# Altium footprint library DIP Component.PcbLib: 327 footprints (part 4 of 21)
Each footprint in its own frame and in the unit in brackets; x right, y up, seen from the top. Pads: shape width x height; smd on the part's side, far side on the other; paste and mask are expansions set on the pad; w line width, h text height; cw(c..) or ccw(c..) is an arc to the next point about the centre after c.
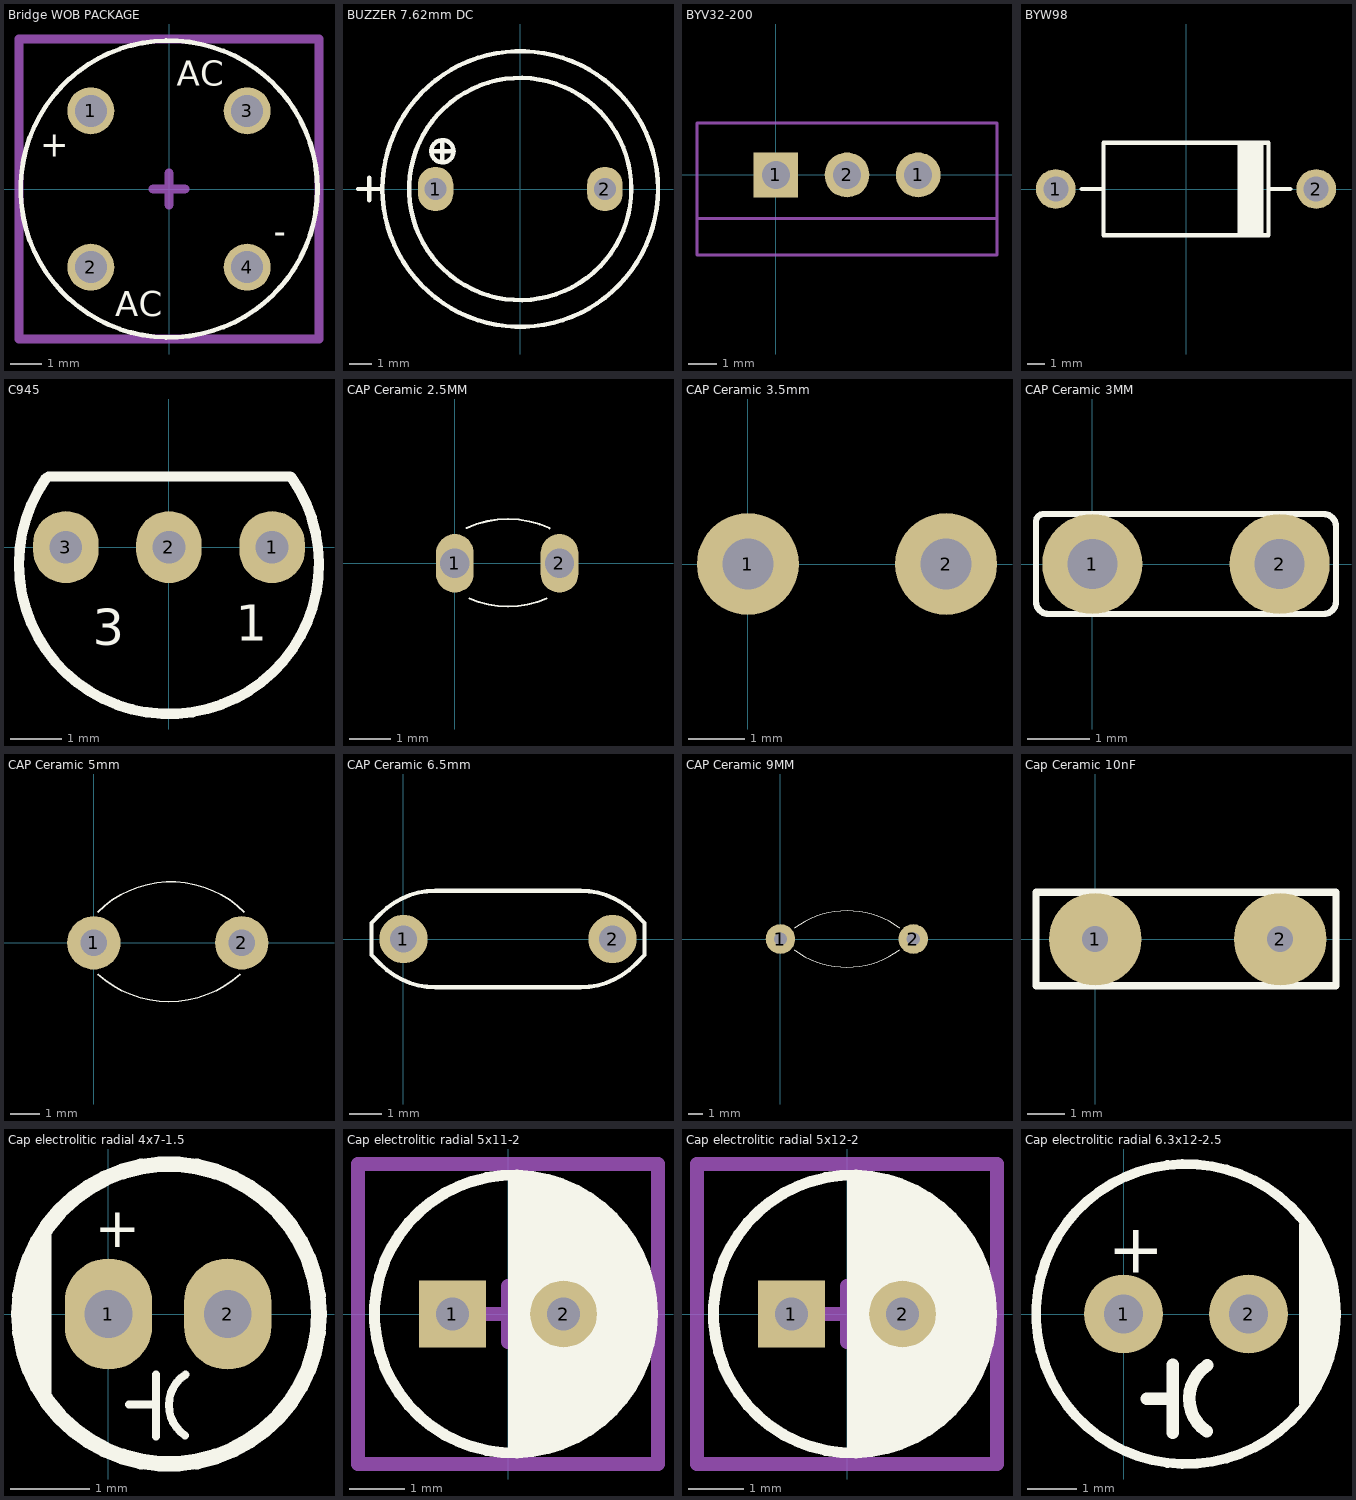
[diagram p3: the footprints below, top view; thin cyan lines are the x and y axes]

## Bridge WOB PACKAGE [mm] "WOB Bridge Rectifiers DESIGNER :ABBAS BASEREH"
height 5.1
pads (4):
  round 1.5 / inner round 1.905 / far side round 1.905 hole 1.016: 1(-2.5,2.5) 2(-2.5,-2.5) 3(2.5,2.5) 4(2.5,-2.5)
Top Overlay:
  circle w0.15: c0,0 r4.75
  text "AC" at 0.25,3.3 h0.8
  text "AC" at -1.725,-4.075 h0.8
  text "+" at -4.125,1.025 h0.8
  text "-" at 3.35,-1.75 h0.8
Mechanical 15:
  lines w0.3: -0.5,0 0.5,0 ; 0,-0.5 0,0.5 ; -4.8,-4.8 4.8,-4.8 4.8,4.8 -4.8,4.8 -4.8,-4.8
3D body "User Library-WOB.STEP": height 5.9, standoff -3.2, extent -4.675,-4.675 4.625,4.625

## BUZZER 7.62mm DC [mm] "BUZZER 12mm DIA , 7.62mm pitch DESIGNER ABBAS BASEREH"
height 7.62
pads (2):
  oval 1.6x2 hole 1: 1(-3.81,0) 2(3.81,0)
Top Overlay:
  circle w0.2: c0,0 r6.2
  circle w0.2: c-3.5,1.7 r0.5
  circle w0.2: c0,0 r5
  lines w0.2: -7.3,0 -6.3,0 ; -6.8,-0.5 -6.8,0.5 ; -4,1.7 -3,1.7 ; -3.5,1.2 -3.5,2.2
3D body "User Library-Buzzer CEM-1205C.step": height 9.5, standoff -3.5, extent -6,-5.997 6,5.997

## BYV32-200 [mm] "BYV32-200"
pads (3):
  rect 1.6x1.6 hole 1: 1(0,0)
  round 1.6 hole 1: 1(5.08,0) 2(2.54,0)
Bottom Overlay:
  circle w0.25: c-2.16,1.2 r0.125
  lines w0.2: -2.81,-2.35 7.89,-2.35 ; -2.81,-2.85 7.89,-2.85 7.89,1.85 -2.81,1.85 -2.81,-2.85
Mechanical 13:
  lines w0.1: -2.81,-1.55 7.89,-1.55 ; -2.81,-2.85 -2.81,1.85 7.89,1.85 7.89,-2.85 -2.81,-2.85
Mechanical 15:
  lines w0.1: 2.04,0 3.04,0 ; 2.54,-0.5 2.54,0.5
3D body: height 19.3, standoff 12.9, extent -2.809,-2.849 7.889,-1.551
3D body: height 12.9, standoff 4, extent -2.86,-2.9 7.94,1.9

## BYW98 [mil]
pads (2):
  round 90 hole 57: 1(-295,0) 2(295,0)
Top Overlay:
  region: 175.2,105 175.2,-105 117.72,-105 117.72,105
  lines w10: -236.22,0 -187,0 ; 187,0 236.22,0 ; -187,-105 -187,105 187,105 187,-105 -187,-105
3D body "BYW98.STEP": height 254.33, standoff -86.22, extent -320.47,-105.51 321.26,103.15

## C945 [mil] "NPN Transistor"
height 236.22
pads (3):
  oval 50x55 hole 25: 1(78.74,0) 2(0,0) 3(-78.74,0)
Top Overlay:
  lines w7.87: -93.81,52.73 ccw(c0.04,-12.83) 93.31,53.54 ; -91.73,53.94 92.13,53.94
  text "3" at -58,-75 h27.56
  text "1" at 51,-71.26 h27.56
3D body "User Library-KSC945 Transistors NPN TO-92 3L (2,54mm).STEP": height 386.81, standoff -381.89, extent -94.48,-85.83 92.91,57.09

## CAP Ceramic 2.5MM [mm] "Bipolar Capacitor-Design:Ali Hafizi"
pads (2):
  oval 0.9x1.4 hole 0.7: 1(0,0) 2(2.5,0)
Top Overlay:
  lines w0.05: 0.284,0.843 cw(c1.27,-1.27) 2.263,0.84 ; 0.348,-0.837 ccw(c1.27,1.27) 2.192,-0.837

## CAP Ceramic 3.5mm [mm] "Bipolar Capacitor-Design:Ali Hafizi"
pads (2):
  round 1.8 hole 0.9: 1(0,0) 2(3.5,0)

## CAP Ceramic 3MM [mm] "Bipolar Capacitor-Design:Ali Hafizi"
pads (2):
  round 1.6 hole 0.8: 1(0,0) 2(3,0)
Top Overlay:
  lines w0.1: -0.9,-0.6 ccw(c-0.7,-0.6) -0.7,-0.8 3.7,-0.8 ccw(c3.7,-0.6) 3.9,-0.6 3.9,-0.1 3.9,0.6 ccw(c3.7,0.6) 3.7,0.8 -0.775,0.8 ccw(c-0.775,0.675) -0.9,0.675 -0.9,0 -0.9,-0.6

## CAP Ceramic 5mm [mm] "Bipolar Capacitor-Design:Ali Hafizi"
pads (2):
  round 1.8 hole 0.9: 1(0,0) 2(5,0)
Top Overlay:
  lines w0.05: 0.13,-1.056 ccw(c2.54,1.608) 4.95,-1.056 ; 0.13,1.039 cw(c2.606,-1.438) 5.083,1.039

## CAP Ceramic 6.5mm [mm] "Bipolar Capacitor-Design:Ali Hafizi"
pads (2):
  round 1.5 hole 0.85: 1(0,0) 2(6.5,0)
Top Overlay:
  lines w0.127: -1,-0.5 -1,0.5 -0.707,0.793 cw(c1,-0.914) 1,1.5 5.5,1.5 cw(c5.5,-0.914) 7.207,0.793 7.5,0.5 7.5,-0.5 7.207,-0.793 cw(c5.5,0.914) 5.5,-1.5 1,-1.5 cw(c1,0.914) -0.707,-0.793 -1,-0.5

## CAP Ceramic 9MM [mm] "Bipolar Capacitor-Design:Ali Hafizi"
pads (2):
  round 2 hole 0.9: 1(0,0) 2(9,0)
Top Overlay:
  lines w0.05: 0.936,-0.744 ccw(c4.495,4.129) 8.072,-0.731 ; 0.945,0.731 cw(c4.522,-4.129) 8.081,0.744

## Cap Ceramic 10nF [mm] "Bipolar Capacitor-Design:Ali Hafizi"
pads (2):
  round 2.5 hole 0.7: 1(0,0) 2(5,0)
Top Overlay:
  lines w0.2: -1.6,-1.26 6.51,-1.26 6.51,1.27 -1.6,1.27 -1.6,-1.26

## Cap electrolitic radial 4x7-1.5 [mm] "Cap electrolitic radial 5x11-2-Design:Ali Hafizi"
pads (2):
  oval 1.1x1.4 hole 0.6: 1(0,0) 2(1.5,0)
Top Overlay:
  circle w0.2: c0.762,0 r1.888
  lines w0.1: 0.26,-1.14 0.6,-1.14 ; 0.6,-1.54 0.6,-0.76 ; 0.966,-1.53 cw(c1.218,-1.147) 0.968,-0.763
  lines w0.2: -1,-0.6 -1,0.6 ; -0.82,-0.98 -0.82,1.02
  text "+" at -0.17,0.84 h0.5
3D body "User Library-Cap 4x7.STEP": height 8.5, standoff -15.5, extent -1.25,-2 2.75,2

## Cap electrolitic radial 5x11-2 [mm] "Cap electrolitic radial 5x11-2-Design:Abbas Basereh"
height 11
pads (2):
  rect 1.2x1.2 hole 0.6: 1(-1,0)
  round 1.2 hole 0.6: 2(1,0)
Top Overlay:
  circle w0.2: c0.096,0 r2.5
  region: 0,2.5 0.1,2.5 0.346,2.5 0.829,2.404 1.284,2.215 1.694,1.942 2.042,1.594 2.315,1.184 2.504,0.729 2.6,0.246 2.6,0 2.6,-0.246 2.504,-0.729 2.315,-1.184 2.042,-1.594 1.694,-1.942 1.284,-2.215 0.829,-2.404 0.346,-2.5 0.1,-2.5 0,-2.5
Mechanical 15:
  lines w0.254: -0.5,0 0.5,0 ; 0,-0.5 0,0.5 ; -2.7,-2.7 -2.7,2.7 2.7,2.7 2.7,-2.7 -2.7,-2.7
3D body "User Library-Cap-EL(5x11-2)T.STEP": height 11.3, standoff -2.5, extent -2.5,-2.498 2.502,2.498

## Cap electrolitic radial 5x12-2 [mm] "Cap electrolitic radial 5x12-2-Design:Abbas Basereh"
height 12
pads (2):
  rect 1.2x1.2 hole 0.6: 1(-1,0)
  round 1.2 hole 0.6: 2(1,0)
Top Overlay:
  circle w0.2: c0.096,0 r2.5
  region: 0,2.5 0.1,2.5 0.346,2.5 0.829,2.404 1.284,2.215 1.694,1.942 2.042,1.594 2.315,1.184 2.504,0.729 2.6,0.246 2.6,0 2.6,-0.246 2.504,-0.729 2.315,-1.184 2.042,-1.594 1.694,-1.942 1.284,-2.215 0.829,-2.404 0.346,-2.5 0.1,-2.5 0,-2.5
Mechanical 15:
  lines w0.254: -0.5,0 0.5,0 ; 0,-0.5 0,0.5 ; -2.7,-2.7 -2.7,2.7 2.7,2.7 2.7,-2.7 -2.7,-2.7
3D body "User Library-CAP-EL5X12_R100_D200_H460.STEP": height 12.2, standoff -2.9, extent -2.54,-2.538 2.54,2.538

## Cap electrolitic radial 6.3x12-2.5 [mm] "Capacitor Electrolytic D=6.3 x H=12 - P=2.5 mm, Altium Compatible"
height 12
pads (2):
  round 1.6 hole 0.8: 1(0,0) 2(2.54,0)
Top Overlay:
  circle w0.2: c1.27,0 r3.048
  lines w0.2: 4.14,-0.97 4.14,1
  lines w0.254: 0.47,-1.72 1,-1.72 ; 1,-2.41 1,-1.03 ; 1.696,-2.387 cw(c2.138,-1.717) 1.7,-1.045 ; 3.69,-1.8 3.69,1.8 ; 3.92,-1.4 3.92,1.4
  text "+" at -0.32,0.84 h1
3D body "User Library-Cap-EL(6_3x12-2_5).step": height 1.2, standoff -14, extent -1.87,-3.09 4.432,3.196